# Altium footprint library PHOENIX THD.PcbLib: 109 footprints (part 6 of 8)
Each footprint in its own frame and in the unit in brackets; x right, y up, seen from the top. Pads: shape width x height; smd on the part's side, far side on the other; paste and mask are expansions set on the pad; w line width, h text height; cw(c..) or ccw(c..) is an arc to the next point about the centre after c.
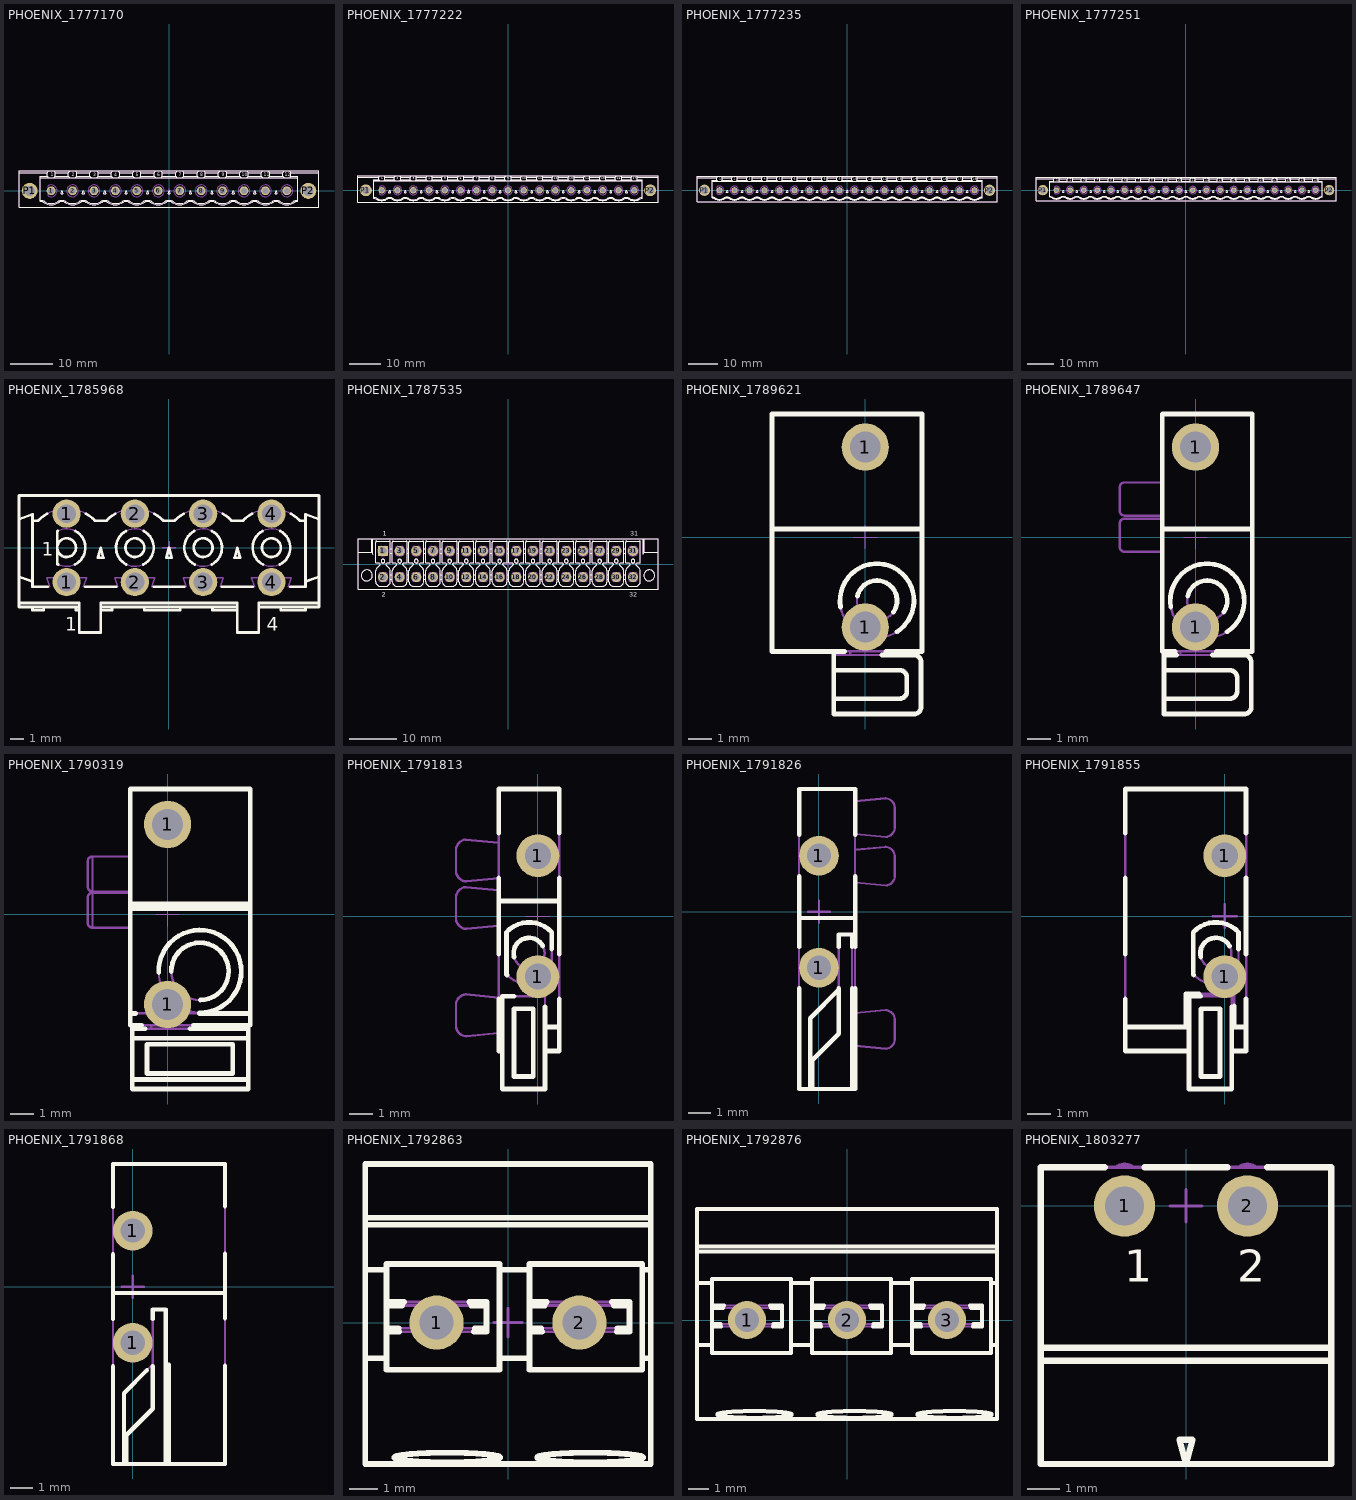
[diagram p5: the footprints below, top view; thin cyan lines are the x and y axes]

## PHOENIX_1777170 [mm] "PCB Header, 12A, 320V, Pitch: 5.08mm, 12 Positions, MSTBV Serie"
height 12
pads (14):
  round 2.1 hole 1.4: 1(-27.94,0) 2(-22.86,0) 3(-17.78,0) 4(-12.7,0) 5(-7.62,0) 6(-2.54,0) 7(2.54,0) 8(7.62,0) 9(12.7,0) 10(17.78,0) 11(22.86,0) 12(27.94,0)
  round 3.8 hole 2.4: P1(-33.02,0) P2(33.02,0)
Top Overlay:
  drawing of 224 lines, arcs and shapes, not listed
  text "5" at -7.823,3.505 h0.75
  text "4" at -12.954,3.505 h0.75
  text "3" at -18.009,3.505 h0.75
  text "2" at -23.08,3.505 h0.75
  text "1" at -28.08,3.505 h0.75
  text "6" at -2.743,3.505 h0.75
  text "7" at 2.337,3.505 h0.75
  text "8" at 7.391,3.505 h0.75
  text "9" at 12.497,3.505 h0.75
  text "10" at 17.272,3.505 h0.75
  text "11" at 22.479,3.505 h0.75
  text "12" at 27.407,3.505 h0.75
Mechanical 8:
  lines w0.1: -33.52,0 -33.02,0 ; -33.02,-0.5 -33.02,0 ; -33.02,0.5 -33.02,0 ; -32.52,0 -33.02,0 ; -28.44,0 -27.94,0 ; -27.94,-0.5 -27.94,0 ; -27.94,0.5 -27.94,0 ; -27.44,0 -27.94,0 ; -23.36,0 -22.86,0 ; -22.86,-0.5 -22.86,0 ; -22.86,0.5 -22.86,0 ; -22.36,0 -22.86,0 ; -18.28,0 -17.78,0 ; -17.78,-0.5 -17.78,0 ; -17.78,0.5 -17.78,0 ; -17.28,0 -17.78,0 ; -13.2,0 -12.7,0 ; -12.7,-0.5 -12.7,0 ; -12.7,0.5 -12.7,0 ; -12.2,0 -12.7,0 ; -8.12,0 -7.62,0 ; -7.62,-0.5 -7.62,0 ; -7.62,0.5 -7.62,0 ; -7.12,0 -7.62,0 ; -3.04,0 -2.54,0 ; -2.54,-0.5 -2.54,0 ; -2.54,0.5 -2.54,0 ; -2.04,0 -2.54,0 ; -0.5,0 0,0 ; 0,-0.5 0,0 ; 0,0.5 0,0 ; 0.5,0 0,0 ; 2.04,0 2.54,0 ; 2.54,-0.5 2.54,0 ; 2.54,0.5 2.54,0 ; 3.04,0 2.54,0 ; 7.12,0 7.62,0 ; 7.62,-0.5 7.62,0 ; 7.62,0.5 7.62,0 ; 8.12,0 7.62,0 ; 12.2,0 12.7,0 ; 12.7,-0.5 12.7,0 ; 12.7,0.5 12.7,0 ; 13.2,0 12.7,0 ; 17.28,0 17.78,0 ; 17.78,-0.5 17.78,0 ; 17.78,0.5 17.78,0 ; 18.28,0 17.78,0 ; 22.36,0 22.86,0 ; 22.86,-0.5 22.86,0 ; 22.86,0.5 22.86,0 ; 23.36,0 22.86,0 ; 27.44,0 27.94,0 ; 27.94,-0.5 27.94,0 ; 27.94,0.5 27.94,0 ; 28.44,0 27.94,0 ; 32.52,0 33.02,0 ; 33.02,-0.5 33.02,0 ; 33.02,0.5 33.02,0 ; 33.52,0 33.02,0
Mechanical 14:
  drawing of 383 lines, arcs and shapes, not listed
  text "12" at 27.407,3.505 h0.75
  text "11" at 22.479,3.505 h0.75
  text "10" at 17.272,3.505 h0.75
  text "9" at 12.497,3.505 h0.75
  text "8" at 7.391,3.505 h0.75
  text "7" at 2.337,3.505 h0.75
  text "6" at -2.743,3.505 h0.75
  text "1" at -28.08,3.505 h0.75
  text "2" at -23.08,3.505 h0.75
  text "3" at -18.009,3.505 h0.75
  text "4" at -12.954,3.505 h0.75
  text "5" at -7.823,3.505 h0.75
3D body "PHOENIX_1777170.stp": height 12, standoff -3.9, extent -35.56,-3.8 35.56,4.8

## PHOENIX_1777222 [mm] "PCB Header, 12A, 320V, Pitch: 5.08mm, 17 Positions, MSTBV Serie"
height 12
pads (19):
  round 2.1 hole 1.4: 1(-40.64,0) 2(-35.56,0) 3(-30.48,0) 4(-25.4,0) 5(-20.32,0) 6(-15.24,0) 7(-10.16,0) 8(-5.08,0) 9(0,0) 10(5.08,0) 11(10.16,0) 12(15.24,0) 13(20.32,0) 14(25.4,0) 15(30.48,0) 16(35.56,0) 17(40.64,0)
  round 3.8 hole 2.4: P1(-45.72,0) P2(45.72,0)
Top Overlay:
  drawing of 314 lines, arcs and shapes, not listed
  text "13" at 19.787,3.505 h0.75
  text "14" at 24.917,3.505 h0.75
  text "15" at 29.972,3.505 h0.75
  text "16" at 35.052,3.505 h0.75
  text "17" at 40.132,3.505 h0.75
  text "12" at 14.707,3.505 h0.75
  text "11" at 9.779,3.505 h0.75
  text "10" at 4.572,3.505 h0.75
  text "9" at -0.203,3.505 h0.75
  text "8" at -5.309,3.505 h0.75
  text "7" at -10.363,3.505 h0.75
  text "6" at -15.443,3.505 h0.75
  text "1" at -40.78,3.505 h0.75
  text "2" at -35.78,3.505 h0.75
  text "3" at -30.709,3.505 h0.75
  text "4" at -25.654,3.505 h0.75
  text "5" at -20.523,3.505 h0.75
Mechanical 8:
  lines w0.1: -46.22,0 -45.72,0 ; -45.72,-0.5 -45.72,0 ; -45.72,0.5 -45.72,0 ; -45.22,0 -45.72,0 ; -41.14,0 -40.64,0 ; -40.64,-0.5 -40.64,0 ; -40.64,0.5 -40.64,0 ; -40.14,0 -40.64,0 ; -36.06,0 -35.56,0 ; -35.56,-0.5 -35.56,0 ; -35.56,0.5 -35.56,0 ; -35.06,0 -35.56,0 ; -30.98,0 -30.48,0 ; -30.48,-0.5 -30.48,0 ; -30.48,0.5 -30.48,0 ; -29.98,0 -30.48,0 ; -25.9,0 -25.4,0 ; -25.4,-0.5 -25.4,0 ; -25.4,0.5 -25.4,0 ; -24.9,0 -25.4,0 ; -20.82,0 -20.32,0 ; -20.32,-0.5 -20.32,0 ; -20.32,0.5 -20.32,0 ; -19.82,0 -20.32,0 ; -15.74,0 -15.24,0 ; -15.24,-0.5 -15.24,0 ; -15.24,0.5 -15.24,0 ; -14.74,0 -15.24,0 ; -13.2,0 -12.7,0 ; -12.7,-0.5 -12.7,0 ; -12.7,0.5 -12.7,0 ; -12.2,0 -12.7,0 ; -10.66,0 -10.16,0 ; -10.16,-0.5 -10.16,0 ; -10.16,0.5 -10.16,0 ; -9.66,0 -10.16,0 ; -5.58,0 -5.08,0 ; -5.08,-0.5 -5.08,0 ; -5.08,0.5 -5.08,0 ; -4.58,0 -5.08,0 ; -0.5,0 0,0 ; 0,-0.5 0,0 ; 0,0.5 0,0 ; 0.5,0 0,0 ; 4.58,0 5.08,0 ; 5.08,-0.5 5.08,0 ; 5.08,0.5 5.08,0 ; 5.58,0 5.08,0 ; 9.66,0 10.16,0 ; 10.16,-0.5 10.16,0 ; 10.16,0.5 10.16,0 ; 10.66,0 10.16,0 ; 14.74,0 15.24,0 ; 15.24,-0.5 15.24,0 ; 15.24,0.5 15.24,0 ; 15.74,0 15.24,0 ; 19.82,0 20.32,0 ; 20.32,-0.5 20.32,0 ; 20.32,0.5 20.32,0 ; 20.82,0 20.32,0 ; 24.9,0 25.4,0 ; 25.4,-0.5 25.4,0 ; 25.4,0.5 25.4,0 ; 25.9,0 25.4,0 ; 29.98,0 30.48,0 ; 30.48,-0.5 30.48,0 ; 30.48,0.5 30.48,0 ; 30.98,0 30.48,0 ; 35.06,0 35.56,0 ; 35.56,-0.5 35.56,0 ; 35.56,0.5 35.56,0 ; 36.06,0 35.56,0 ; 40.14,0 40.64,0 ; 40.64,-0.5 40.64,0 ; 40.64,0.5 40.64,0 ; 41.14,0 40.64,0 ; 45.22,0 45.72,0 ; 45.72,-0.5 45.72,0 ; 45.72,0.5 45.72,0 ; 46.22,0 45.72,0
Mechanical 14:
  drawing of 538 lines, arcs and shapes, not listed
  text "5" at -20.523,3.505 h0.75
  text "4" at -25.654,3.505 h0.75
  text "3" at -30.709,3.505 h0.75
  text "2" at -35.78,3.505 h0.75
  text "1" at -40.78,3.505 h0.75
  text "6" at -15.443,3.505 h0.75
  text "7" at -10.363,3.505 h0.75
  text "8" at -5.309,3.505 h0.75
  text "9" at -0.203,3.505 h0.75
  text "10" at 4.572,3.505 h0.75
  text "11" at 9.779,3.505 h0.75
  text "12" at 14.707,3.505 h0.75
  text "17" at 40.132,3.505 h0.75
  text "16" at 35.052,3.505 h0.75
  text "15" at 29.972,3.505 h0.75
  text "14" at 24.917,3.505 h0.75
  text "13" at 19.787,3.505 h0.75
3D body "PHOENIX_1777222.stp": height 12, standoff -3.9, extent -48.26,-3.8 48.26,4.8

## PHOENIX_1777235 [mm] "PCB Header, 12A, 320V, Pitch: 5.08mm, 18 Positions, MSTBV Series"
height 12
pads (20):
  round 2.1 hole 1.4: 1(-43.18,0) 2(-38.1,0) 3(-33.02,0) 4(-27.94,0) 5(-22.86,0) 6(-17.78,0) 7(-12.7,0) 8(-7.62,0) 9(-2.54,0) 10(2.54,0) 11(7.62,0) 12(12.7,0) 13(17.78,0) 14(22.86,0) 15(27.94,0) 16(33.02,0) 17(38.1,0) 18(43.18,0)
  round 3.8 hole 2.4: P1(-48.26,0) P2(48.26,0)
Top Overlay:
  drawing of 332 lines, arcs and shapes, not listed
  text "17" at 37.592,3.505 h0.75
  text "18" at 42.621,3.505 h0.75
  text "5" at -23.063,3.505 h0.75
  text "4" at -28.194,3.505 h0.75
  text "3" at -33.249,3.505 h0.75
  text "2" at -38.32,3.505 h0.75
  text "1" at -43.32,3.505 h0.75
  text "6" at -17.983,3.505 h0.75
  text "7" at -12.903,3.505 h0.75
  text "8" at -7.849,3.505 h0.75
  text "9" at -2.743,3.505 h0.75
  text "10" at 2.032,3.505 h0.75
  text "11" at 7.239,3.505 h0.75
  text "12" at 12.167,3.505 h0.75
  text "16" at 32.512,3.505 h0.75
  text "15" at 27.432,3.505 h0.75
  text "14" at 22.377,3.505 h0.75
  text "13" at 17.247,3.505 h0.75
Mechanical 8:
  lines w0.05: -48.76,0 -48.26,0 ; -48.26,-0.5 -48.26,0 ; -48.26,0.5 -48.26,0 ; -47.76,0 -48.26,0 ; -43.68,0 -43.18,0 ; -43.18,-0.5 -43.18,0 ; -43.18,0.5 -43.18,0 ; -42.68,0 -43.18,0 ; -38.6,0 -38.1,0 ; -38.1,-0.5 -38.1,0 ; -38.1,0.5 -38.1,0 ; -37.6,0 -38.1,0 ; -33.52,0 -33.02,0 ; -33.02,-0.5 -33.02,0 ; -33.02,0.5 -33.02,0 ; -32.52,0 -33.02,0 ; -28.44,0 -27.94,0 ; -27.94,-0.5 -27.94,0 ; -27.94,0.5 -27.94,0 ; -27.44,0 -27.94,0 ; -23.36,0 -22.86,0 ; -22.86,-0.5 -22.86,0 ; -22.86,0.5 -22.86,0 ; -22.36,0 -22.86,0 ; -18.28,0 -17.78,0 ; -17.78,-0.5 -17.78,0 ; -17.78,0.5 -17.78,0 ; -17.28,0 -17.78,0 ; -13.2,0 -12.7,0 ; -12.7,-0.5 -12.7,0 ; -12.7,0.5 -12.7,0 ; -12.2,0 -12.7,0 ; -8.12,0 -7.62,0 ; -7.62,-0.5 -7.62,0 ; -7.62,0.5 -7.62,0 ; -7.12,0 -7.62,0 ; -3.04,0 -2.54,0 ; -2.54,-0.5 -2.54,0 ; -2.54,0.5 -2.54,0 ; -2.04,0 -2.54,0 ; -0.5,0 0,0 ; 0,-0.5 0,0 ; 0,0.5 0,0 ; 0.5,0 0,0 ; 2.04,0 2.54,0 ; 2.54,-0.5 2.54,0 ; 2.54,0.5 2.54,0 ; 3.04,0 2.54,0 ; 7.12,0 7.62,0 ; 7.62,-0.5 7.62,0 ; 7.62,0.5 7.62,0 ; 8.12,0 7.62,0 ; 12.2,0 12.7,0 ; 12.7,-0.5 12.7,0 ; 12.7,0.5 12.7,0 ; 13.2,0 12.7,0 ; 17.28,0 17.78,0 ; 17.78,-0.5 17.78,0 ; 17.78,0.5 17.78,0 ; 18.28,0 17.78,0 ; 22.36,0 22.86,0 ; 22.86,-0.5 22.86,0 ; 22.86,0.5 22.86,0 ; 23.36,0 22.86,0 ; 27.44,0 27.94,0 ; 27.94,-0.5 27.94,0 ; 27.94,0.5 27.94,0 ; 28.44,0 27.94,0 ; 32.52,0 33.02,0 ; 33.02,-0.5 33.02,0 ; 33.02,0.5 33.02,0 ; 33.52,0 33.02,0 ; 37.6,0 38.1,0 ; 38.1,-0.5 38.1,0 ; 38.1,0.5 38.1,0 ; 38.6,0 38.1,0 ; 42.68,0 43.18,0 ; 43.18,-0.5 43.18,0 ; 43.18,0.5 43.18,0 ; 43.68,0 43.18,0 ; 47.76,0 48.26,0 ; 48.26,-0.5 48.26,0 ; 48.26,0.5 48.26,0 ; 48.76,0 48.26,0
Mechanical 14:
  drawing of 569 lines, arcs and shapes, not listed
  text "17" at 37.592,3.505 h0.75
  text "13" at 17.247,3.505 h0.75
  text "14" at 22.377,3.505 h0.75
  text "15" at 27.432,3.505 h0.75
  text "16" at 32.512,3.505 h0.75
  text "12" at 12.167,3.505 h0.75
  text "11" at 7.239,3.505 h0.75
  text "10" at 2.032,3.505 h0.75
  text "9" at -2.743,3.505 h0.75
  text "8" at -7.849,3.505 h0.75
  text "7" at -12.903,3.505 h0.75
  text "6" at -17.983,3.505 h0.75
  text "1" at -43.32,3.505 h0.75
  text "2" at -38.32,3.505 h0.75
  text "3" at -33.249,3.505 h0.75
  text "4" at -28.194,3.505 h0.75
  text "5" at -23.063,3.505 h0.75
  text "18" at 42.621,3.505 h0.75
3D body "PHOENIX_1777235.stp": height 11.65, standoff -4.25, extent -50.8,-3.8 50.8,4.8

## PHOENIX_1777251 [mm] "PCB Header, 12A, 320V, Pitch: 5.08mm, 20 Positions, MSTBV Serie"
height 12
pads (22):
  round 2.1 hole 1.4: 1(-48.26,0) 2(-43.18,0) 3(-38.1,0) 4(-33.02,0) 5(-27.94,0) 6(-22.86,0) 7(-17.78,0) 8(-12.7,0) 9(-7.62,0) 10(-2.54,0) 11(2.54,0) 12(7.62,0) 13(12.7,0) 14(17.78,0) 15(22.86,0) 16(27.94,0) 17(33.02,0) 18(38.1,0) 19(43.18,0) 20(48.26,0)
  round 3.8 hole 2.4: P1(-53.34,0) P2(53.34,0)
Top Overlay:
  drawing of 368 lines, arcs and shapes, not listed
  text "13" at 12.167,3.505 h0.75
  text "14" at 17.297,3.505 h0.75
  text "15" at 22.352,3.505 h0.75
  text "16" at 27.432,3.505 h0.75
  text "17" at 32.512,3.505 h0.75
  text "12" at 7.087,3.505 h0.75
  text "11" at 2.159,3.505 h0.75
  text "10" at -3.048,3.505 h0.75
  text "9" at -7.823,3.505 h0.75
  text "8" at -12.929,3.505 h0.75
  text "7" at -17.983,3.505 h0.75
  text "6" at -23.063,3.505 h0.75
  text "1" at -48.4,3.505 h0.75
  text "2" at -43.4,3.505 h0.75
  text "3" at -38.329,3.505 h0.75
  text "4" at -33.274,3.505 h0.75
  text "5" at -28.143,3.505 h0.75
  text "18" at 37.567,3.505 h0.75
  text "19" at 42.672,3.505 h0.75
  text "20" at 47.701,3.505 h0.75
Mechanical 8:
  lines w0.1: -53.84,0 -53.34,0 ; -53.34,-0.5 -53.34,0 ; -53.34,0.5 -53.34,0 ; -52.84,0 -53.34,0 ; -48.76,0 -48.26,0 ; -48.26,-0.5 -48.26,0 ; -48.26,0.5 -48.26,0 ; -47.76,0 -48.26,0 ; -43.68,0 -43.18,0 ; -43.18,-0.5 -43.18,0 ; -43.18,0.5 -43.18,0 ; -42.68,0 -43.18,0 ; -38.6,0 -38.1,0 ; -38.1,-0.5 -38.1,0 ; -38.1,0.5 -38.1,0 ; -37.6,0 -38.1,0 ; -33.52,0 -33.02,0 ; -33.02,-0.5 -33.02,0 ; -33.02,0.5 -33.02,0 ; -32.52,0 -33.02,0 ; -28.44,0 -27.94,0 ; -27.94,-0.5 -27.94,0 ; -27.94,0.5 -27.94,0 ; -27.44,0 -27.94,0 ; -23.36,0 -22.86,0 ; -22.86,-0.5 -22.86,0 ; -22.86,0.5 -22.86,0 ; -22.36,0 -22.86,0 ; -20.82,0 -20.32,0 ; -20.32,-0.5 -20.32,0 ; -20.32,0.5 -20.32,0 ; -19.82,0 -20.32,0 ; -18.28,0 -17.78,0 ; -17.78,-0.5 -17.78,0 ; -17.78,0.5 -17.78,0 ; -17.28,0 -17.78,0 ; -13.2,0 -12.7,0 ; -12.7,-0.5 -12.7,0 ; -12.7,0.5 -12.7,0 ; -12.2,0 -12.7,0 ; -8.12,0 -7.62,0 ; -7.62,-0.5 -7.62,0 ; -7.62,0.5 -7.62,0 ; -7.12,0 -7.62,0 ; -3.04,0 -2.54,0 ; -2.54,-0.5 -2.54,0 ; -2.54,0.5 -2.54,0 ; -2.04,0 -2.54,0 ; 2.04,0 2.54,0 ; 2.54,-0.5 2.54,0 ; 2.54,0.5 2.54,0 ; 3.04,0 2.54,0 ; 7.12,0 7.62,0 ; 7.62,-0.5 7.62,0 ; 7.62,0.5 7.62,0 ; 8.12,0 7.62,0 ; 12.2,0 12.7,0 ; 12.7,-0.5 12.7,0 ; 12.7,0.5 12.7,0 ; 13.2,0 12.7,0 ; 17.28,0 17.78,0 ; 17.78,-0.5 17.78,0 ; 17.78,0.5 17.78,0 ; 18.28,0 17.78,0 ; 22.36,0 22.86,0 ; 22.86,-0.5 22.86,0 ; 22.86,0.5 22.86,0 ; 23.36,0 22.86,0 ; 27.44,0 27.94,0 ; 27.94,-0.5 27.94,0 ; 27.94,0.5 27.94,0 ; 28.44,0 27.94,0 ; 32.52,0 33.02,0 ; 33.02,-0.5 33.02,0 ; 33.02,0.5 33.02,0 ; 33.52,0 33.02,0 ; 37.6,0 38.1,0 ; 38.1,-0.5 38.1,0 ; 38.1,0.5 38.1,0 ; 38.6,0 38.1,0 ; 42.68,0 43.18,0 ; 43.18,-0.5 43.18,0 ; 43.18,0.5 43.18,0 ; 43.68,0 43.18,0 ; 47.76,0 48.26,0 ; 48.26,-0.5 48.26,0 ; 48.26,0.5 48.26,0 ; 48.76,0 48.26,0 ; 52.84,0 53.34,0 ; 53.34,-0.5 53.34,0 ; 53.34,0.5 53.34,0 ; 53.84,0 53.34,0
Mechanical 14:
  drawing of 631 lines, arcs and shapes, not listed
  text "20" at 47.701,3.505 h0.75
  text "19" at 42.672,3.505 h0.75
  text "18" at 37.567,3.505 h0.75
  text "5" at -28.143,3.505 h0.75
  text "4" at -33.274,3.505 h0.75
  text "3" at -38.329,3.505 h0.75
  text "2" at -43.4,3.505 h0.75
  text "1" at -48.4,3.505 h0.75
  text "6" at -23.063,3.505 h0.75
  text "7" at -17.983,3.505 h0.75
  text "8" at -12.929,3.505 h0.75
  text "9" at -7.823,3.505 h0.75
  text "10" at -3.048,3.505 h0.75
  text "11" at 2.159,3.505 h0.75
  text "12" at 7.087,3.505 h0.75
  text "17" at 32.512,3.505 h0.75
  text "16" at 27.432,3.505 h0.75
  text "15" at 22.352,3.505 h0.75
  text "14" at 17.297,3.505 h0.75
  text "13" at 12.167,3.505 h0.75
3D body "PHOENIX_1777251.stp": height 12, standoff -3.9, extent -55.88,-3.8 55.88,4.8

## PHOENIX_1785968 [mm] "PCB Header, 12A, 320V, Pitch: 5.08mm, 4 Positions, ICV Serie"
height 19
pads (8):
  round 2.1 hole 1.4: 1(-7.62,-2.54) 1(-7.62,2.54) 2(-2.54,-2.54) 2(-2.54,2.54) 3(2.54,-2.54) 3(2.54,2.54) 4(7.62,-2.54) 4(7.62,2.54)
Top Overlay:
  circle w0.2: c-7.62,0.015 r0.7
  circle w0.2: c-2.54,0.015 r0.7
  circle w0.2: c2.54,0.015 r0.7
  circle w0.2: c7.62,0.015 r0.7
  lines w0.2: -11.16,-4.1 -6.68,-4.1 -6.68,-6.3 -5.08,-6.3 -5.08,-4.1 5.08,-4.1 5.08,-6.3 6.68,-6.3 6.68,-4.1 11.16,-4.1 ; -11.16,-2.136 -10.16,-2.5 ; -11.16,2.136 -10.16,2.5 -10.16,-2.9 -9.025,-2.9 ; -10.16,-4.4 -10.16,-4.65 -9.32,-4.65 -9.32,-4.4 ; -10.16,2.015 -9.741,2.015 cw(c-7.62,0.015) -9.07,2.544 ; -8.281,1.249 ccw(c-7.62,0.015) -8.32,1.227 -8.32,-1.197 ccw(c-7.62,0.015) -8.251,-1.235 ; -6.989,-1.235 ccw(c-7.62,0.015) -6.959,1.249 ; -6.92,-4.412 -6.92,-4.65 -6.68,-4.65 ; -6.68,-4.4 -11.16,-4.4 -11.16,3.9 11.16,3.9 11.16,-4.4 6.68,-4.4 ; -6.215,-2.9 -3.945,-2.9 ; -6.17,2.544 cw(c-7.62,0.015) -5.499,2.015 -4.661,2.015 cw(c-2.54,0.015) -3.99,2.544 ; -5.08,-4.65 -4.24,-4.65 -4.24,-4.4 ; -5.08,-4.4 5.08,-4.4 ; -3.201,1.249 ccw(c-2.54,0.015) -3.171,-1.235 ; -1.909,-1.235 ccw(c-2.54,0.015) -1.879,1.249 ; -1.84,-4.4 -1.84,-4.65 0.84,-4.65 0.84,-4.4 ; -1.135,-2.9 1.135,-2.9 ; -1.09,2.544 cw(c-2.54,0.015) -0.419,2.015 0.419,2.015 cw(c2.54,0.015) 1.09,2.544 ; 1.879,1.249 ccw(c2.54,0.015) 1.909,-1.235 ; 3.171,-1.235 ccw(c2.54,0.015) 3.201,1.249 ; 3.24,-4.4 3.24,-4.65 5.08,-4.65 ; 3.945,-2.9 6.215,-2.9 ; 3.99,2.544 cw(c2.54,0.015) 4.661,2.015 5.499,2.015 cw(c7.62,0.015) 6.17,2.544 ; 6.959,1.249 ccw(c7.62,0.015) 6.989,-1.235 ; 8.251,-1.235 ccw(c7.62,0.015) 8.281,1.249 ; 8.32,-4.414 8.32,-4.65 10.16,-4.65 10.16,-4.4 ; 9.025,-2.9 10.16,-2.9 10.16,2.5 11.16,2.136 ; 9.07,2.544 cw(c7.62,0.015) 9.741,2.015 10.16,2.015 ; 10.16,-2.5 11.16,-2.136 ; -5.281,-0.735 -5.08,0.015 -4.879,-0.735 -5.281,-0.735 ; -0.201,-0.735 0,0 0.201,-0.735 -0.201,-0.735 ; 4.879,-0.735 5.08,0.015 5.281,-0.735 4.879,-0.735
  text "4" at 7.266,-6.18 h1
  text "1" at -7.735,-6.18 h1
  text "1" at -9.46,-0.58 h1
Mechanical 8:
  lines w0.1: -8.12,-2.54 -7.62,-2.54 ; -8.12,2.54 -7.62,2.54 ; -7.62,-3.04 -7.62,-2.54 ; -7.62,-2.04 -7.62,-2.54 ; -7.62,2.04 -7.62,2.54 ; -7.62,3.04 -7.62,2.54 ; -7.12,-2.54 -7.62,-2.54 ; -7.12,2.54 -7.62,2.54 ; -3.04,-2.54 -2.54,-2.54 ; -3.04,2.54 -2.54,2.54 ; -2.54,-3.04 -2.54,-2.54 ; -2.54,-2.04 -2.54,-2.54 ; -2.54,2.04 -2.54,2.54 ; -2.54,3.04 -2.54,2.54 ; -2.04,-2.54 -2.54,-2.54 ; -2.04,2.54 -2.54,2.54 ; -0.5,0 0,0 ; 0,-0.5 0,0 ; 0,0.5 0,0 ; 0.5,0 0,0 ; 2.04,-2.54 2.54,-2.54 ; 2.04,2.54 2.54,2.54 ; 2.54,-3.04 2.54,-2.54 ; 2.54,-2.04 2.54,-2.54 ; 2.54,2.04 2.54,2.54 ; 2.54,3.04 2.54,2.54 ; 3.04,-2.54 2.54,-2.54 ; 3.04,2.54 2.54,2.54 ; 7.12,-2.54 7.62,-2.54 ; 7.12,2.54 7.62,2.54 ; 7.62,-3.04 7.62,-2.54 ; 7.62,-2.04 7.62,-2.54 ; 7.62,2.04 7.62,2.54 ; 7.62,3.04 7.62,2.54 ; 8.12,-2.54 7.62,-2.54 ; 8.12,2.54 7.62,2.54
Mechanical 14:
  circle w0.1: c-7.62,0.015 r0.7
  circle w0.1: c-2.54,0.015 r0.7
  circle w0.1: c-2.54,0.015 r1.4
  circle w0.1: c2.54,0.015 r0.7
  circle w0.1: c2.54,0.015 r1.4
  circle w0.1: c7.62,0.015 r0.7
  circle w0.1: c7.62,0.015 r1.4
  lines w0.1: -11.16,-4.1 -6.68,-4.1 -6.68,-6.3 -5.08,-6.3 -5.08,-4.1 5.08,-4.1 5.08,-6.3 6.68,-6.3 6.68,-4.1 11.16,-4.1 ; -11.16,-2.136 -10.16,-2.5 ; -11.16,2.136 -10.16,2.5 -10.16,-2.9 -8.875,-2.9 -9.11,-2.22 -6.13,-2.22 -6.365,-2.9 -3.795,-2.9 -4.03,-2.22 -1.05,-2.22 -1.285,-2.9 1.285,-2.9 1.05,-2.22 4.03,-2.22 3.795,-2.9 6.365,-2.9 6.13,-2.22 9.11,-2.22 8.875,-2.9 10.16,-2.9 10.16,2.5 11.16,2.136 ; -10.16,-4.4 -10.16,-4.65 -9.32,-4.65 -9.32,-4.4 ; -10.16,2.015 -9.741,2.015 cw(c-7.62,0.015) -5.499,2.015 -4.661,2.015 cw(c-2.54,0.015) -0.419,2.015 0.419,2.015 cw(c2.54,0.015) 4.661,2.015 5.499,2.015 cw(c7.62,0.015) 9.741,2.015 10.16,2.015 ; -6.92,-4.412 -6.92,-4.65 -6.68,-4.65 ; -6.68,-4.4 -11.16,-4.4 -11.16,3.9 11.16,3.9 11.16,-4.4 6.68,-4.4 ; -5.08,-4.65 -4.24,-4.65 -4.24,-4.4 ; -5.08,-4.4 5.08,-4.4 ; -1.84,-4.4 -1.84,-4.65 0.84,-4.65 0.84,-4.4 ; 3.24,-4.4 3.24,-4.65 5.08,-4.65 ; 8.32,-4.414 8.32,-4.65 10.16,-4.65 10.16,-4.4 ; 10.16,-2.5 11.16,-2.136 ; -8.32,-1.197 ccw(c-7.62,0.015) -8.32,1.227 -8.32,-1.197 ; -5.281,-0.735 -5.08,0.015 -4.879,-0.735 -5.281,-0.735 ; -0.201,-0.735 0,0 0.201,-0.735 -0.201,-0.735 ; 4.879,-0.735 5.08,0.015 5.281,-0.735 4.879,-0.735
  text "4" at 7.266,-6.18 h1
  text "1" at -7.735,-6.18 h1
  text "1" at -9.46,-0.58 h1
3D body "PHOENIX_1785968.stp": height 19, standoff -3.6, extent -11.16,-6.3 11.16,3.9

## PHOENIX_1787535 [mm] "8A, 160V, Pitch 3.5mm, 16 Positions with 32 Contacts Header"
height 10
pads (64):
  rect 2.1x2.1 hole 1.4: 1(-26.25,2.75)
  round 2.1 smd: 1(-26.25,2.75) 2(-26.25,-2.75) 3(-22.75,2.75) 4(-22.75,-2.75) 5(-19.25,2.75) 6(-19.25,-2.75) 7(-15.75,2.75) 8(-15.75,-2.75) 9(-12.25,2.75) 10(-12.25,-2.75) 11(-8.75,2.75) 12(-8.75,-2.75) 13(-5.25,2.75) 14(-5.25,-2.75) 15(-1.75,2.75) 16(-1.75,-2.75) 17(1.75,2.75) 18(1.75,-2.75) 19(5.25,2.75) 20(5.25,-2.75) 21(8.75,2.75) 22(8.75,-2.75) 23(12.25,2.75) 24(12.25,-2.75) 25(15.75,2.75) 26(15.75,-2.75) 27(19.25,2.75) 28(19.25,-2.75) 29(22.75,2.75) 30(22.75,-2.75) 31(26.25,2.75) 32(26.25,-2.75)
  round 2.1 hole 1.4: 2(-26.25,-2.75) 3(-22.75,2.75) 4(-22.75,-2.75) 5(-19.25,2.75) 6(-19.25,-2.75) 7(-15.75,2.75) 8(-15.75,-2.75) 9(-12.25,2.75) 10(-12.25,-2.75) 11(-8.75,2.75) 12(-8.75,-2.75) 13(-5.25,2.75) 14(-5.25,-2.75) 15(-1.75,2.75) 16(-1.75,-2.75) 17(1.75,2.75) 18(1.75,-2.75) 19(5.25,2.75) 20(5.25,-2.75) 21(8.75,2.75) 22(8.75,-2.75) 23(12.25,2.75) 24(12.25,-2.75) 25(15.75,2.75) 26(15.75,-2.75) 27(19.25,2.75) 28(19.25,-2.75) 29(22.75,2.75) 30(22.75,-2.75) 31(26.25,2.75) 32(26.25,-2.75)
Top Overlay:
  drawing of 410 lines, arcs and shapes, not listed
  text "32" at 25.5,-6.9 h1
  text "31" at 25.7,5.9 h1
  text "1" at -26.35,5.9 h1
  text "2" at -26.55,-6.9 h1
Mechanical 8:
  lines w0.1: -26.75,-2.75 -26.25,-2.75 -26.25,-3.25 ; -26.75,2.75 -26.25,2.75 -26.25,2.25 ; -23.25,-2.75 -22.75,-2.75 -22.75,-3.25 ; -23.25,2.75 -22.75,2.75 -22.75,2.25 ; -19.75,-2.75 -19.25,-2.75 -19.25,-3.25 ; -19.75,2.75 -19.25,2.75 -19.25,2.25 ; -16.25,-2.75 -15.75,-2.75 -15.75,-3.25 ; -16.25,2.75 -15.75,2.75 -15.75,2.25 ; -12.75,-2.75 -12.25,-2.75 -12.25,-3.25 ; -12.75,2.75 -12.25,2.75 -12.25,2.25 ; -9.25,-2.75 -8.75,-2.75 -8.75,-3.25 ; -9.25,2.75 -8.75,2.75 -8.75,2.25 ; -5.75,-2.75 -5.25,-2.75 -5.25,-3.25 ; -5.75,2.75 -5.25,2.75 -5.25,2.25 ; -2.25,-2.75 -1.75,-2.75 -1.75,-3.25 ; -2.25,2.75 -1.75,2.75 -1.75,2.25 ; -0.5,0 0,0 ; 0,-0.5 0,0 ; 0,0.5 0,0 ; 0.5,0 0,0 ; 1.25,-2.75 1.75,-2.75 1.75,-3.25 ; 1.25,2.75 1.75,2.75 1.75,2.25 ; 4.75,-2.75 5.25,-2.75 5.25,-3.25 ; 4.75,2.75 5.25,2.75 5.25,2.25 ; 8.25,-2.75 8.75,-2.75 8.75,-3.25 ; 8.25,2.75 8.75,2.75 8.75,2.25 ; 11.75,-2.75 12.25,-2.75 12.25,-3.25 ; 11.75,2.75 12.25,2.75 12.25,2.25 ; 15.25,-2.75 15.75,-2.75 15.75,-3.25 ; 15.25,2.75 15.75,2.75 15.75,2.25 ; 18.75,-2.75 19.25,-2.75 19.25,-3.25 ; 18.75,2.75 19.25,2.75 19.25,2.25 ; 22.25,-2.75 22.75,-2.75 22.75,-3.25 ; 22.25,2.75 22.75,2.75 22.75,2.25 ; 25.75,-2.75 26.25,-2.75 26.25,-3.25 ; 25.75,2.75 26.25,2.75 26.25,2.25
Mechanical 14:
  drawing of 922 lines, arcs and shapes, not listed
  text "32" at 25.5,-6.9 h1
  text "31" at 25.7,5.9 h1
  text "1" at -26.35,5.9 h1
  text "2" at -26.55,-6.9 h1
3D body "PHOENIX_1787535.stp": height 10, standoff -2, extent -31.5,-5.3 31.5,5.3

## PHOENIX_1789621 [mm] "12A 160V, End Terminal Block, Pitch 3.81mm, 1 Position,  Spring Cage Connection (Conductor/PCB Connection Direction : 90°)"
height 14
pads (2):
  round 2 hole 1.3: 1(0,-3.81) 1(0,3.81)
Top Overlay:
  lines w0.2: -3.95,0.34 2.4,0.34 ; -1.34,-6.84 1.46,-6.84 ccw(c1.46,-6.54) 1.76,-6.54 1.76,-5.94 ccw(c1.46,-5.94) 1.46,-5.64 -1.34,-5.64 ; -1.34,-4.84 -1.34,-7.49 2.06,-7.49 ccw(c2.06,-7.19) 2.36,-7.19 2.36,-5.29 ccw(c2.06,-5.29) 2.06,-4.99 0.71,-4.99 ; -1.047,-2.958 cw(c0.495,-2.69) 1.335,-4.01 ; -0.873,-4.84 -3.95,-4.84 -3.95,5.21 2.4,5.21 2.4,-4.84 0.873,-4.84 ; -0.334,-2.502 cw(c0.495,-2.69) 1.192,-3.176
Mechanical 8:
  lines w0.05: -0.5,-3.81 0,-3.81 ; -0.5,0 0,0 ; -0.5,3.81 0,3.81 ; 0,-4.31 0,-3.81 ; 0,-3.31 0,-3.81 ; 0,-0.5 0,0 ; 0,0.5 0,0 ; 0,3.31 0,3.81 ; 0,4.31 0,3.81 ; 0.5,-3.81 0,-3.81 ; 0.5,0 0,0 ; 0.5,3.81 0,3.81
Mechanical 14:
  circle w0.1: c0.495,-2.69 r1.565
  circle w0.1: c0.495,-2.69 r0.85
  lines w0.1: -3.95,0.34 2.4,0.34 ; -1.34,-6.84 1.46,-6.84 ccw(c1.46,-6.54) 1.76,-6.54 1.76,-5.94 ccw(c1.46,-5.94) 1.46,-5.64 -1.34,-5.64 ; -1.34,-4.99 2.06,-4.99 cw(c2.06,-5.29) 2.36,-5.29 2.36,-7.19 cw(c2.06,-7.19) 2.06,-7.49 -1.34,-7.49 -1.34,-4.84 ; -0.64,-4.99 -0.64,-4.84 ; -3.95,-4.84 -3.95,5.21 2.4,5.21 2.4,-4.84 -3.95,-4.84
3D body "PHOENIX_1789621.stp": height 13.6, standoff -3.4, extent -3.95,-7.49 2.4,5.21

## PHOENIX_1789647 [mm] "12A 160V, Terminal Block, Pitch 3.81mm, 1 Position,  Spring Cage Connection (Conductor/PCB Connection Direction : 90°)"
height 14
pads (2):
  round 2 hole 1.3: 1(0,-3.81) 1(0,3.81)
Top Overlay:
  lines w0.2: -1.41,0.34 2.4,0.34 ; -1.34,-6.84 1.46,-6.84 ccw(c1.46,-6.54) 1.76,-6.54 1.76,-5.94 ccw(c1.46,-5.94) 1.46,-5.64 -1.34,-5.64 ; -1.34,-4.99 -0.803,-4.99 ; -1.34,-4.84 -1.34,-7.49 2.06,-7.49 ccw(c2.06,-7.19) 2.36,-7.19 2.36,-5.29 ccw(c2.06,-5.29) 2.06,-4.99 0.71,-4.99 ; -1.047,-2.958 cw(c0.495,-2.69) 1.335,-4.01 ; -0.873,-4.84 -1.41,-4.84 -1.41,5.21 2.4,5.21 2.4,-4.84 0.873,-4.84 ; -0.334,-2.502 cw(c0.495,-2.69) 1.192,-3.176
Mechanical 8:
  lines w0.05: -0.5,-3.81 0,-3.81 ; -0.5,0 0,0 ; -0.5,3.81 0,3.81 ; 0,-4.31 0,-3.81 ; 0,-3.31 0,-3.81 ; 0,-0.5 0,0 ; 0,0.5 0,0 ; 0,3.31 0,3.81 ; 0,4.31 0,3.81 ; 0.5,-3.81 0,-3.81 ; 0.5,0 0,0 ; 0.5,3.81 0,3.81
Mechanical 14:
  circle w0.1: c0.495,-2.69 r0.85
  circle w0.1: c0.495,-2.69 r1.565
  lines w0.1: -1.41,-0.62 -3.01,-0.62 cw(c-3.01,-0.42) -3.21,-0.42 -3.21,0.58 cw(c-3.01,0.58) -3.01,0.78 -1.41,0.78 ; -1.41,0.34 2.4,0.34 ; -1.41,0.91 -3.01,0.91 cw(c-3.01,1.11) -3.21,1.11 -3.21,2.11 cw(c-3.01,2.11) -3.01,2.31 -1.41,2.31 ; -1.34,-6.84 1.46,-6.84 ccw(c1.46,-6.54) 1.76,-6.54 1.76,-5.94 ccw(c1.46,-5.94) 1.46,-5.64 -1.34,-5.64 ; -1.34,-4.99 2.06,-4.99 cw(c2.06,-5.29) 2.36,-5.29 2.36,-7.19 cw(c2.06,-7.19) 2.06,-7.49 -1.34,-7.49 -1.34,-4.84 ; -0.64,-4.99 -0.64,-4.84 ; -1.41,-4.84 2.4,-4.84 2.4,5.21 -1.41,5.21 -1.41,-4.84
3D body "PHOENIX_1789647.stp": height 13.6, standoff -3.4, extent -3.21,-7.49 2.4,5.21

## PHOENIX_1790319 [mm] "15A 320V, Terminal Block, Pitch 5.08mm, 1 Position, Spring Cage Connection (Conductor/PCB Connection Direction: 90°)"
height 13.6
pads (2):
  round 2 hole 1.3: 1(0,-3.81) 1(0,3.81)
Top Overlay:
  lines w0.2: -1.58,-4.19 -1.347,-4.19 ; -1.58,0.24 3.5,0.24 ; -1.58,0.44 3.5,0.44 ; -1.49,-6.99 3.41,-6.99 ; -1.49,-5.24 3.41,-5.24 ; -1.49,-4.84 -0.948,-4.84 ; -1.49,-4.69 -1.49,-7.39 3.41,-7.39 3.41,-4.84 0.948,-4.84 ; -1.089,-4.69 -1.58,-4.69 -1.58,5.31 3.5,5.31 3.5,-4.69 1.089,-4.69 ; -0.379,-2.462 cw(c1.37,-2.41) 1.356,-4.16 ; 0.155,-2.419 cw(c1.37,-2.41) 1.388,-3.625 ; 1.347,-4.19 3.5,-4.19 ; -0.87,-6.73 2.76,-6.73 2.76,-5.5 -0.87,-5.5 -0.87,-6.73
Mechanical 8:
  lines w0.05: -0.5,-3.81 0,-3.81 ; -0.5,0 0,0 ; -0.5,3.81 0,3.81 ; 0,-4.31 0,-3.81 ; 0,-3.31 0,-3.81 ; 0,-0.5 0,0 ; 0,0.5 0,0 ; 0,3.31 0,3.81 ; 0,4.31 0,3.81 ; 0.5,-3.81 0,-3.81 ; 0.5,0 0,0 ; 0.5,3.81 0,3.81
Mechanical 14:
  circle w0.1: c1.37,-2.41 r1.215
  circle w0.1: c1.37,-2.41 r1.75
  lines w0.1: -1.58,-4.19 3.5,-4.19 ; -1.58,-0.56 -3.18,-0.56 ; -1.58,0.24 3.5,0.24 ; -1.58,0.44 3.5,0.44 ; -1.58,0.92 -3.18,0.92 ; -1.58,0.97 -3.18,0.97 ; -1.58,2.45 -3.18,2.45 ; -1.49,-6.99 3.41,-6.99 ; -1.49,-5.24 3.41,-5.24 ; -1.49,-4.84 3.41,-4.84 3.41,-7.39 -1.49,-7.39 -1.49,-4.69 ; -0.69,-4.84 -0.69,-4.69 ; -3.18,-0.56 cw(c-3.18,-0.36) -3.38,-0.36 -3.38,0.72 cw(c-3.18,0.72) -3.18,0.92 ; -3.18,-0.56 -3.18,0.92 ; -3.18,0.97 cw(c-3.18,1.17) -3.38,1.17 -3.38,2.25 cw(c-3.18,2.25) -3.18,2.45 ; -3.18,0.97 -3.18,2.45 ; -1.58,-4.69 3.5,-4.69 3.5,5.31 -1.58,5.31 -1.58,-4.69 ; -0.87,-6.73 2.76,-6.73 2.76,-5.5 -0.87,-5.5 -0.87,-6.73
3D body "PHOENIX_1790319.stp": height 13.6, standoff -3.4, extent -3.38,-7.39 3.5,5.31

## PHOENIX_1791813 [mm] "6A 160V, Terminal Block, Pitch2.54mm, 1 Positions,  Spring Cage Connection (Conductor/PCB connection direction: 90 °)"
height 13.6
pads (2):
  round 1.8 hole 1.1: 1(0,-2.54) 1(0,2.54)
Top Overlay:
  lines w0.2: -1.64,-4.66 -1.5,-4.66 ; -1.64,-3.478 -1.64,-5.66 -1.5,-5.66 ; -1.64,-1.602 -1.64,1.602 ; -1.64,0.64 0.9,0.64 ; -1.64,3.478 -1.64,5.34 0.9,5.34 0.9,3.478 ; -1.298,-2.47 cw(c-0.37,-1.56) -1.32,-2.447 -1.32,-0.673 cw(c-0.37,-1.56) 0.58,-0.673 0.58,-1.377 ; -1.009,-3.36 -1.5,-3.36 -1.5,-7.26 0.3,-7.26 0.3,-3.805 ; -1.002,-1.712 cw(c-0.37,-1.56) 0.205,-1.256 ; 0.3,-5.66 0.9,-5.66 0.9,-3.478 ; 0.3,-4.66 0.9,-4.66 ; 0.9,-1.602 0.9,1.602 ; -1,-6.735 -1,-3.885 -0.2,-3.885 -0.2,-6.735 -1,-6.735
Mechanical 8:
  lines w0.05: -0.5,-2.54 0,-2.54 ; -0.5,0 0,0 ; -0.5,2.54 0,2.54 ; 0,-3.04 0,-2.54 ; 0,-2.04 0,-2.54 ; 0,-0.5 0,0 ; 0,0.5 0,0 ; 0,2.04 0,2.54 ; 0,3.04 0,2.54 ; 0.5,-2.54 0,-2.54 ; 0.5,0 0,0 ; 0.5,2.54 0,2.54
Mechanical 14:
  circle w0.1: c-0.37,-1.56 r0.65
  lines w0.1: -1.641,-4.906 -3.016,-5.041 cw(c-2.995,-4.595) -3.44,-4.634 -3.44,-3.694 cw(c-2.993,-3.735) -3.035,-3.288 -1.641,-3.422 ; -1.641,-0.397 -3.016,-0.533 cw(c-2.995,-0.086) -3.44,-0.126 -3.44,0.815 cw(c-2.993,0.774) -3.035,1.221 -1.641,1.087 ; -1.641,1.598 -3.016,1.463 cw(c-2.995,1.909) -3.44,1.87 -3.44,2.81 cw(c-2.993,2.769) -3.035,3.216 -1.641,3.082 ; -1.64,-4.66 -1.5,-4.66 ; -1.64,0.64 0.9,0.64 ; -1.5,-5.66 -1.64,-5.66 -1.64,5.34 0.9,5.34 0.9,-5.66 0.3,-5.66 ; 0.3,-4.66 0.9,-4.66 ; -1.5,-7.26 -1.5,-3.36 0.3,-3.36 0.3,-7.26 -1.5,-7.26 ; -1.32,-2.447 ccw(c-0.37,-1.56) 0.58,-2.447 0.58,-0.673 ccw(c-0.37,-1.56) -1.32,-0.673 -1.32,-2.447 ; -1,-6.735 -1,-3.885 -0.2,-3.885 -0.2,-6.735 -1,-6.735
3D body "PHOENIX_1791813.stp": height 13.6, standoff -3.4, extent -3.44,-7.26 0.9,5.34

## PHOENIX_1791826 [mm] "6A 160V, Terminal Block, Pitch2.54mm, 1 Positions,  Spring Cage Connection (Conductor/PCB connection direction: 0 °)"
height 12.6
pads (2):
  round 1.8 hole 1.1: 1(0,-2.54) 1(0,2.54)
Top Overlay:
  lines w0.2: -0.9,-3.478 -0.9,-8.04 1.64,-8.04 1.64,-3.478 ; -0.9,-1.602 -0.9,1.602 ; -0.9,-0.29 1.64,-0.29 ; -0.9,3.478 -0.9,5.56 1.64,5.56 1.64,3.478 ; -0.4,-8.017 -0.4,-4.827 0.887,-3.54 ; -0.3,-8.04 -0.3,-6.74 0.9,-5.54 0.9,-3.478 ; 0.9,-1.602 0.9,-1.037 1.5,-1.037 1.5,-1.602 ; 1.5,-8.04 1.5,-3.478 ; 1.64,-1.602 1.64,1.602
Mechanical 8:
  lines w0.1: -0.5,-2.54 0,-2.54 ; -0.5,0 0,0 ; -0.5,2.54 0,2.54 ; 0,-3.04 0,-2.54 ; 0,-2.04 0,-2.54 ; 0,-0.5 0,0 ; 0,0.5 0,0 ; 0,2.04 0,2.54 ; 0,3.04 0,2.54 ; 0.5,-2.54 0,-2.54 ; 0.5,0 0,0 ; 0.5,2.54 0,2.54
Mechanical 14:
  lines w0.1: -0.9,-0.29 1.64,-0.29 ; -0.4,-8.017 -0.4,-4.827 0.887,-3.54 ; -0.3,-8.04 -0.3,-6.74 0.9,-5.54 0.9,-1.037 1.5,-1.037 1.5,-8.04 ; 1.641,-6.082 3.035,-6.216 ccw(c2.993,-5.769) 3.44,-5.81 3.44,-4.87 ccw(c2.995,-4.909) 3.016,-4.463 1.641,-4.598 ; 1.641,1.318 3.035,1.184 ccw(c2.993,1.631) 3.44,1.59 3.44,2.53 ccw(c2.995,2.491) 3.016,2.937 1.641,2.802 ; 1.641,3.518 3.035,3.384 ccw(c2.993,3.831) 3.44,3.79 3.44,4.73 ccw(c2.995,4.691) 3.016,5.137 1.641,5.002 ; -0.9,-8.04 -0.9,5.56 1.64,5.56 1.64,-8.04 -0.9,-8.04
3D body "PHOENIX_1791826.stp": height 12.6, standoff -3.6, extent -0.9,-8.04 3.44,5.56

## PHOENIX_1791855 [mm] "6A 160V, End Terminal Block, Pitch2.54mm, 1 Positions,  Spring Cage Connection (Conductor/PCB connection direction: 90 °)"
height 13.6
pads (2):
  round 1.8 hole 1.1: 1(0,-2.54) 1(0,2.54)
Top Overlay:
  lines w0.2: -4.18,-4.66 -1.5,-4.66 ; -4.18,-3.478 -4.18,-5.66 -1.5,-5.66 ; -4.18,-1.602 -4.18,1.602 ; -4.18,3.478 -4.18,5.34 0.9,5.34 0.9,3.478 ; -1.64,-4.66 -1.64,-3.26 -1.082,-3.26 ; -1.298,-2.47 cw(c-0.37,-1.56) -1.32,-2.447 -1.32,-0.673 cw(c-0.37,-1.56) 0.58,-0.673 0.58,-1.377 ; -1.009,-3.36 -1.5,-3.36 -1.5,-7.26 0.3,-7.26 0.3,-3.805 ; -1.002,-1.712 cw(c-0.37,-1.56) 0.205,-1.256 ; 0.3,-5.66 0.9,-5.66 0.9,-3.478 ; 0.3,-4.66 0.9,-4.66 ; 0.4,-4.66 0.4,-3.777 ; 0.9,-1.602 0.9,1.602 ; -1,-6.735 -1,-3.885 -0.2,-3.885 -0.2,-6.735 -1,-6.735
Mechanical 8:
  lines w0.1: -0.5,-2.54 0,-2.54 ; -0.5,0 0,0 ; -0.5,2.54 0,2.54 ; 0,-3.04 0,-2.54 ; 0,-2.04 0,-2.54 ; 0,-0.5 0,0 ; 0,0.5 0,0 ; 0,2.04 0,2.54 ; 0,3.04 0,2.54 ; 0.5,-2.54 0,-2.54 ; 0.5,0 0,0 ; 0.5,2.54 0,2.54
Mechanical 14:
  circle w0.1: c-0.37,-1.56 r0.65
  lines w0.1: -4.18,-4.66 -1.5,-4.66 ; -1.64,-4.66 -1.64,-3.26 0.4,-3.26 0.4,-4.66 ; -1.5,-5.66 -4.18,-5.66 -4.18,5.34 0.9,5.34 0.9,-5.66 0.3,-5.66 ; 0.3,-4.66 0.9,-4.66 ; -1.5,-7.26 0.3,-7.26 0.3,-3.36 -1.5,-3.36 -1.5,-7.26 ; -1.32,-2.447 ccw(c-0.37,-1.56) 0.58,-2.447 0.58,-0.673 ccw(c-0.37,-1.56) -1.32,-0.673 -1.32,-2.447 ; -1,-6.735 -1,-3.885 -0.2,-3.885 -0.2,-6.735 -1,-6.735
3D body "PHOENIX_1791855.stp": height 13.6, standoff -3.4, extent -4.18,-7.26 0.9,5.34

## PHOENIX_1791868 [mm] "6A 160V, End Terminal Block, Pitch2.54mm, 1 Positions,  Spring Cage Connection (Conductor/PCB connection direction: 0 °)"
height 12.6
pads (2):
  round 1.8 hole 1.1: 1(0,-2.54) 1(0,2.54)
Top Overlay:
  lines w0.2: -0.9,-3.612 -0.9,-8.04 4.18,-8.04 ; -0.9,-1.468 -0.9,1.468 ; -0.9,-0.29 4.18,-0.29 ; -0.9,3.612 -0.9,5.529 ; -0.9,5.56 4.18,5.56 4.18,3.643 ; -0.4,-8.04 -0.4,-4.827 0.643,-3.784 ; -0.3,-8.04 -0.3,-6.74 0.9,-5.54 0.9,-3.612 ; 0.9,-1.468 0.9,-1.037 1.5,-1.037 1.5,-8.04 ; 1.5,-3.54 1.64,-3.54 1.64,-8.04 ; 4.18,-8.009 4.18,-3.582 ; 4.18,-1.437 4.18,1.498
Mechanical 8:
  lines w0.1: -0.5,-2.54 0,-2.54 ; -0.5,0 0,0 ; -0.5,2.54 0,2.54 ; 0,-3.04 0,-2.54 ; 0,-2.04 0,-2.54 ; 0,-0.5 0,0 ; 0,0.5 0,0 ; 0,2.04 0,2.54 ; 0,3.04 0,2.54 ; 0.5,-2.54 0,-2.54 ; 0.5,0 0,0 ; 0.5,2.54 0,2.54
Mechanical 14:
  lines w0.1: -0.9,-0.29 4.18,-0.29 ; -0.9,5.529 -0.9,-8.04 4.18,-8.04 4.18,5.56 -0.9,5.56 ; -0.4,-8.04 -0.4,-4.827 0.887,-3.54 0.9,-3.54 ; -0.3,-8.04 -0.3,-6.74 0.9,-5.54 0.9,-1.037 1.5,-1.037 1.5,-8.04 ; 1.5,-3.54 1.64,-3.54 1.64,-8.04
3D body "PHOENIX_1791868.stp": height 12.6, standoff -3.6, extent -0.9,-8.04 4.18,5.56

## PHOENIX_1792863 [mm] "PHOENIX PTS Serie, Pitch 5mm, 12A, 400V, 2 Positions Header"
height 13.6
pads (2):
  round 1.9 hole 1.2: 1(-2.5,0) 2(2.5,0)
Top Overlay:
  drawing of 294 lines, arcs and shapes, not listed
Mechanical 8:
  lines w0.1: -2.5,0 -2,0 -2.5,0 ; -2.5,0 -2.5,-0.5 -2.5,0 ; -2.5,0 -2.5,0.5 -2.5,0 ; -2.5,0 -3,0 -2.5,0 ; 0,0 0.5,0 0,0 ; 0,0 0,-0.5 0,0 ; 0,0 0,0.5 0,0 ; 0,0 -0.5,0 0,0 ; 2.5,0 3,0 2.5,0 ; 2.5,0 2.5,-0.5 2.5,0 ; 2.5,0 2.5,0.5 2.5,0 ; 2.5,0 2,0 2.5,0
Mechanical 14:
  drawing of 286 lines, arcs and shapes, not listed
3D body "PHOENIX_1792863.stp": height 13.6, standoff -2.49, extent -5,-4.95 5,5.55

## PHOENIX_1792876 [mm] "PHOENIX PTS Serie, Pitch 5mm, 12A, 400V, 3 Positions Header"
height 13.6
pads (3):
  round 1.9 hole 1.2: 1(-5,0) 2(0,0) 3(5,0)
Top Overlay:
  drawing of 437 lines, arcs and shapes, not listed
Mechanical 8:
  lines w0.1: -5.5,0 -5,0 ; -5,-0.5 -5,0 ; -5,0.5 -5,0 ; -4.5,0 -5,0 ; -0.5,0 0,0 ; 0,-0.5 0,0 ; 0,0.5 0,0 ; 0.5,0 0,0 ; 4.5,0 5,0 ; 5,-0.5 5,0 ; 5,0.5 5,0 ; 5.5,0 5,0
Mechanical 14:
  drawing of 425 lines, arcs and shapes, not listed
3D body "PHOENIX_1792876.stp": height 13.6, standoff -2.49, extent -7.5,-4.95 7.5,5.55

## PHOENIX_1803277 [mm] "PHOENIX MC Serie, Pitch 3.81mm, 8A, 160V, 2 Positions Right Angled Header"
height 7.25
pads (2):
  round 1.9 hole 1.2: 1(-1.905,0) 2(1.905,0)
Top Overlay:
  lines w0.2: -4.505,-4.8 4.505,-4.8 ; -4.505,-4.4 4.505,-4.4 ; -2.523,1.2 -4.505,1.2 -4.505,-8 4.505,-8 4.505,1.2 2.523,1.2 ; -1.287,1.2 1.287,1.2 ; -0.201,-7.25 0,-8 0.2,-7.25 -0.201,-7.25
  text "1" at -1.921,-2.35 h1
  text "2" at 1.589,-2.35 h1
Mechanical 8:
  lines w0.1: -2.405,0 -1.905,0 ; -1.905,-0.5 -1.905,0 ; -1.905,0.5 -1.905,0 ; -1.405,0 -1.905,0 ; -0.5,0 0,0 ; 0,-0.5 0,0 ; 0,0.5 0,0 ; 0.5,0 0,0 ; 1.405,0 1.905,0 ; 1.905,-0.5 1.905,0 ; 1.905,0.5 1.905,0 ; 2.405,0 1.905,0
Mechanical 14:
  lines w0.1: -4.505,-4.8 4.505,-4.8 ; -4.505,-4.4 4.505,-4.4 ; -2.17,1.2 cw(c-1.905,0.9) -1.64,1.2 ; 1.64,1.2 cw(c1.905,0.9) 2.17,1.2 ; -4.505,-8 -4.505,1.2 4.505,1.2 4.505,-8 -4.505,-8 ; -0.201,-7.25 0,-8 0.2,-7.25 -0.201,-7.25
3D body "PHOENIX_1803277.stp": height 7.25, standoff -3.4, extent -4.505,-8 4.505,1.3